# Altium footprint library Led & Displays.PcbLib: 52 footprints (part 2 of 4)
Each footprint in its own frame and in the unit in brackets; x right, y up, seen from the top. Pads: shape width x height; smd on the part's side, far side on the other; paste and mask are expansions set on the pad; w line width, h text height; cw(c..) or ccw(c..) is an arc to the next point about the centre after c.
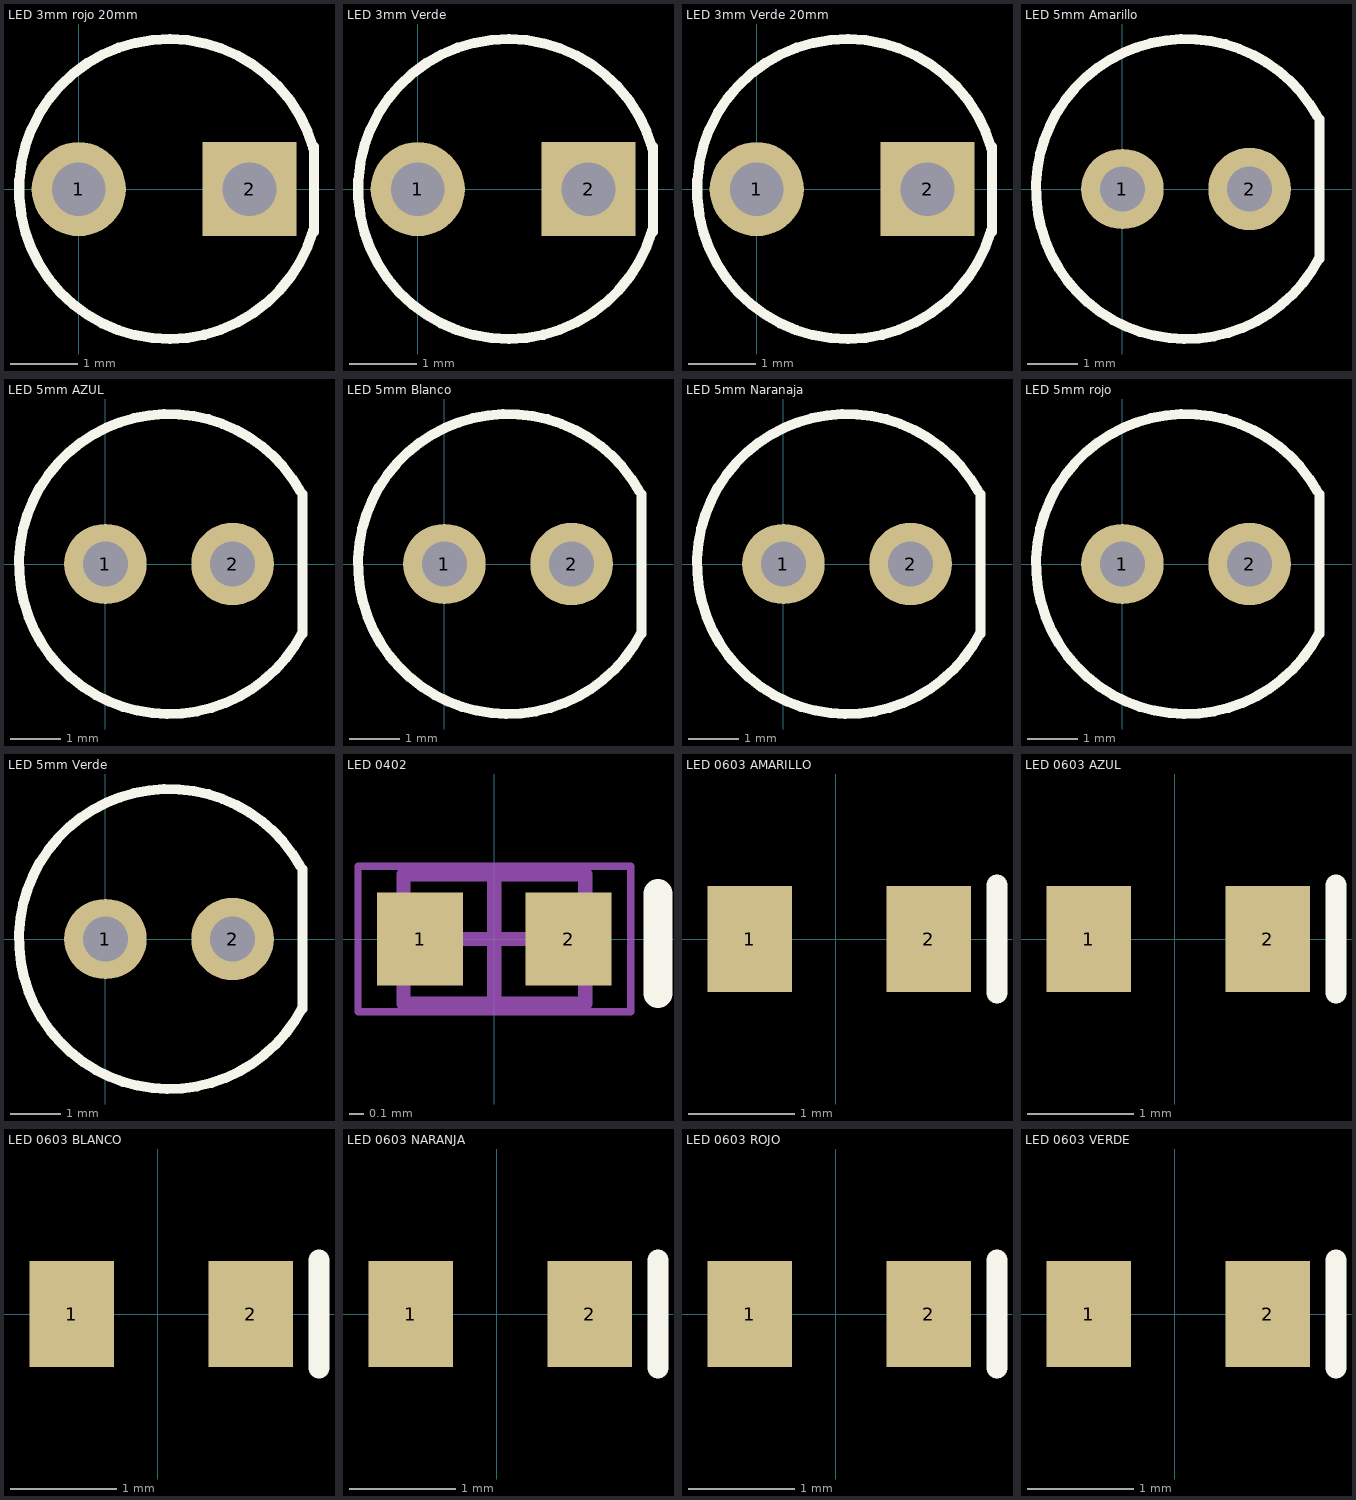
[diagram p1: the footprints below, top view; thin cyan lines are the x and y axes]

## LED 3mm rojo 20mm [mm] "LED estándar 3mm"
pads (2):
  round 1.4 hole 0.8: 1(0,0)
  rect 1.4x1.4 hole 0.8: 2(2.54,0)
Top Overlay:
  lines w0.15: 3.486,-0.615 cw(c1.342,0.002) 3.488,0.615 ; 3.5,-0.635 3.5,0.635
3D body "LED 3mm Red 21mm Leads.step": height 23.39, standoff -2.99, extent -0.655,-1.924 2.84,1.924

## LED 3mm Verde [mm] "LED estándar 3mm"
pads (2):
  round 1.4 hole 0.8: 1(0,0)
  rect 1.4x1.4 hole 0.8: 2(2.54,0)
Top Overlay:
  lines w0.15: 3.486,-0.615 cw(c1.342,0.002) 3.488,0.615 ; 3.5,-0.635 3.5,0.635
3D body "LED 3mm Green 3mm Leads.step": height 5.39, standoff -3.74, extent -0.655,-1.924 2.79,1.924

## LED 3mm Verde 20mm [mm] "LED estándar 3mm"
pads (2):
  round 1.4 hole 0.8: 1(0,0)
  rect 1.4x1.4 hole 0.8: 2(2.54,0)
Top Overlay:
  lines w0.15: 3.486,-0.615 cw(c1.342,0.002) 3.488,0.615 ; 3.5,-0.635 3.5,0.635
3D body "LED 3mm Green 21mm Leads.step": height 23.39, standoff -2.99, extent -0.655,-1.924 2.84,1.924

## LED 5mm Amarillo [mm] "LED 5mm Amarillo TH"
pads (2):
  oval 1.65x1.6 hole 0.9: 1(0,0)
  round 1.65 hole 0.9: 2(2.54,0)
Top Overlay:
  lines w0.2: 3.892,1.457 ccw(c1.27,0) 3.925,-1.397 ; 3.937,-1.397 3.937,1.397
3D body "Led 5mm Amarillo.STEP": height 9.31, standoff -5.49, extent -1.778,-2.972 3.642,3.048

## LED 5mm AZUL [mm] "LED 5mm AZUL TROUGH HOLE"
pads (2):
  oval 1.65x1.6 hole 0.9: 1(0,0)
  round 1.65 hole 0.9: 2(2.54,0)
Top Overlay:
  lines w0.2: 3.892,1.457 ccw(c1.27,0) 3.925,-1.397 ; 3.937,-1.397 3.937,1.397
3D body "LED 5mm AZUL.STEP": height 10.31, standoff -4.49, extent -1.71,-3.01 3.71,3.01

## LED 5mm Blanco [mm] "LED 5mm Blanco TH"
pads (2):
  oval 1.65x1.6 hole 0.9: 1(0,0)
  round 1.65 hole 0.9: 2(2.54,0)
Top Overlay:
  lines w0.2: 3.892,1.457 ccw(c1.27,0) 3.925,-1.397 ; 3.937,-1.397 3.937,1.397
3D body "Led 5mm white.STEP": height 9.31, standoff -5.49, extent -1.651,-2.972 3.769,3.048

## LED 5mm Naranaja [mm] "LED 5mm Naranja TH"
pads (2):
  oval 1.65x1.6 hole 0.9: 1(0,0)
  round 1.65 hole 0.9: 2(2.54,0)
Top Overlay:
  lines w0.2: 3.892,1.457 ccw(c1.27,0) 3.925,-1.397 ; 3.937,-1.397 3.937,1.397
3D body "Led 5mm Naranja.STEP": height 9.31, standoff -5.49, extent -1.778,-2.972 3.642,3.048

## LED 5mm rojo [mm] "LED 5mm rojo TH"
pads (2):
  oval 1.65x1.6 hole 0.9: 1(0,0)
  round 1.65 hole 0.9: 2(2.54,0)
Top Overlay:
  lines w0.2: 3.892,1.457 ccw(c1.27,0) 3.925,-1.397 ; 3.937,-1.397 3.937,1.397
3D body "LED5mmR.step": height 9.25, standoff -4.25, extent -1.73,-3 3.77,3

## LED 5mm Verde [mm] "LED 5mm verde TH"
pads (2):
  oval 1.65x1.6 hole 0.9: 1(0,0)
  round 1.65 hole 0.9: 2(2.54,0)
Top Overlay:
  lines w0.2: 3.892,1.457 ccw(c1.27,0) 3.925,-1.397 ; 3.937,-1.397 3.937,1.397
3D body "Led 5mm verde.STEP": height 9.31, standoff -5.49, extent -1.778,-2.972 3.642,3.048

## LED 0402 [mm] "LED SMD 0402"
pads (2):
  rect 0.6x0.65 smd: 1(-0.519,0) 2(0.519,0)
Top Overlay:
  lines w0.2: 1.143,-0.381 1.143,0.318
Mechanical 13:
  lines w0.1: -0.635,-0.45 0.635,-0.45 0.635,0.45 -0.635,0.45 -0.635,-0.45
Mechanical 15:
  lines w0.05: -0.953,-0.508 0.953,-0.508 0.953,0.508 -0.953,0.508 -0.953,-0.508
  lines w0.1: -0.45,0 0.45,0 ; 0,-0.45 0,0.45
3D body "LED 0402.step": height 0.45, standoff 0, extent -0.505,-0.25 0.505,0.25

## LED 0603 AMARILLO [mm] "LED 0603 YELLOW SMD"
pads (2):
  rect 0.8x1 smd: 1(-0.813,0) 2(0.877,0)
Top Overlay:
  lines w0.2: 1.524,-0.508 1.524,0.508
3D body "LED 0603 YELLOW.step": height 0.8, standoff 0, extent -0.8,-0.4 0.8,0.4

## LED 0603 AZUL [mm] "LED 0603 BLUE SMD"
pads (2):
  rect 0.8x1 smd: 1(-0.813,0) 2(0.877,0)
Top Overlay:
  lines w0.2: 1.524,-0.508 1.524,0.508
3D body "LED 0603 BLUE.step": height 0.8, standoff 0, extent -0.8,-0.4 0.8,0.4

## LED 0603 BLANCO [mm] "LED 0603 WHITE SMD"
pads (2):
  rect 0.8x1 smd: 1(-0.813,0) 2(0.877,0)
Top Overlay:
  lines w0.2: 1.524,-0.508 1.524,0.508
3D body "LED 0603 WHITE.step": height 0.8, standoff 0, extent -0.8,-0.4 0.8,0.4

## LED 0603 NARANJA [mm] "LED 0603 ORANGE SMD"
pads (2):
  rect 0.8x1 smd: 1(-0.813,0) 2(0.877,0)
Top Overlay:
  lines w0.2: 1.524,-0.508 1.524,0.508
3D body "LED 0603 ORANGE.step": height 0.8, standoff 0, extent -0.8,-0.4 0.8,0.4

## LED 0603 ROJO [mm] "LED 0603 RED SMD"
pads (2):
  rect 0.8x1 smd: 1(-0.813,0) 2(0.877,0)
Top Overlay:
  lines w0.2: 1.524,-0.508 1.524,0.508
3D body "LED 0603 RED.step": height 0.8, standoff 0, extent -0.8,-0.4 0.8,0.4

## LED 0603 VERDE [mm] "LED 0603 GREEN SMD"
pads (2):
  rect 0.8x1 smd: 1(-0.813,0) 2(0.877,0)
Top Overlay:
  lines w0.2: 1.524,-0.508 1.524,0.508
3D body "LED 0603 GREEN.step": height 0.8, standoff 0, extent -0.8,-0.4 0.8,0.4